# Altium footprint library 6-Connectors-3.PcbLib: 153 footprints (part 4 of 11) (continued)
## PHOENIX_1725711 [mm] "Micro PCB Terminal Block, Pitch 2.54mm, 8 Positions, Screw Connection" (continued)
3D body "PHOENIX_1725711.stp": height 8.5, standoff -3.5, extent -10.39,-3.1 10.39,3.1

## PHOENIX_1725724 [mm] "Micro PCB Terminal Block, Pitch 2.54mm, 9 Positions, Screw Connection"
height 8.5
pads (9):
  round 1.8 hole 1.1: 1(-10.16,0) 2(-7.62,0) 3(-5.08,0) 4(-2.54,0) 5(0,0) 6(2.54,0) 7(5.08,0) 8(7.62,0) 9(10.16,0)
Top Overlay:
  circle w0.2: c10.16,0.05 r1.18
  circle w0.2: c7.62,0.05 r1.18
  circle w0.2: c5.08,0.05 r1.18
  circle w0.2: c2.54,0.05 r1.18
  circle w0.2: c0,0.05 r1.18
  circle w0.2: c-2.54,0.05 r1.18
  circle w0.2: c-5.08,0.05 r1.18
  circle w0.2: c-7.62,0.05 r1.18
  circle w0.2: c-10.16,0.05 r1.18
  lines w0.2: -11.66,-1.417 11.66,-1.417 ; -11.66,-1.132 11.66,-1.132 ; -11.66,1.22 11.66,1.22 ; -11.66,1.51 11.66,1.51 ; -11.66,2.361 11.66,2.361 ; -11.66,2.8 11.66,2.8 ; -10.16,3.429 -10.16,3.81 ; -7.62,3.429 -7.62,3.81 ; -5.08,3.429 -5.08,3.81 ; -2.54,3.429 -2.54,3.81 ; 0,3.429 0,3.81 ; 2.54,3.429 2.54,3.81 ; 5.08,3.429 5.08,3.81 ; 7.62,3.429 7.62,3.81 ; 10.16,3.429 10.16,3.81 ; -11.66,-3.1 11.66,-3.1 11.66,3.1 -11.66,3.1 -11.66,-3.1
  text "9" at 9.779,-1.778 h1
  text "8" at 7.239,-1.778 h1
  text "6" at 2.159,-1.778 h1
  text "4" at -2.921,-1.778 h1
  text "1" at -10.287,-1.778 h1
  text "2" at -8.001,-1.778 h1
  text "3" at -5.461,-1.778 h1
  text "5" at -0.381,-1.778 h1
  text "7" at 4.699,-1.778 h1
Mechanical 8:
  lines w0.1: -10.71,0 -10.16,0 ; -10.71,0 -10.16,0 ; -10.71,0 -10.16,0 ; -10.71,0 -10.16,0 ; -10.16,0 -10.16,0.55 ; -10.16,0 -10.16,0.55 ; -10.16,0 -10.16,0.55 ; -10.16,0 -10.16,0.55 ; -8.17,0 -7.62,0 ; -8.17,0 -7.62,0 ; -8.17,0 -7.62,0 ; -8.17,0 -7.62,0 ; -7.62,0 -7.62,0.55 ; -7.62,0 -7.62,0.55 ; -7.62,0 -7.62,0.55 ; -7.62,0 -7.62,0.55 ; -5.63,0 -5.08,0 ; -5.63,0 -5.08,0 ; -5.63,0 -5.08,0 ; -5.63,0 -5.08,0 ; -5.08,0 -5.08,0.55 ; -5.08,0 -5.08,0.55 ; -5.08,0 -5.08,0.55 ; -5.08,0 -5.08,0.55 ; -3.09,0 -2.54,0 ; -3.09,0 -2.54,0 ; -3.09,0 -2.54,0 ; -3.09,0 -2.54,0 ; -2.54,0 -2.54,0.55 ; -2.54,0 -2.54,0.55 ; -2.54,0 -2.54,0.55 ; -2.54,0 -2.54,0.55 ; -0.55,0 0,0 ; -0.55,0 0,0 ; -0.55,0 0,0 ; -0.55,0 0,0 ; 0,0 0,0.55 ; 0,0 0,0.55 ; 0,0 0,0.55 ; 0,0 0,0.55 ; 1.99,0 2.54,0 ; 1.99,0 2.54,0 ; 1.99,0 2.54,0 ; 1.99,0 2.54,0 ; 2.54,0 2.54,0.55 ; 2.54,0 2.54,0.55 ; 2.54,0 2.54,0.55 ; 2.54,0 2.54,0.55 ; 4.53,0 5.08,0 ; 4.53,0 5.08,0 ; 4.53,0 5.08,0 ; 4.53,0 5.08,0 ; 5.08,0 5.08,0.55 ; 5.08,0 5.08,0.55 ; 5.08,0 5.08,0.55 ; 5.08,0 5.08,0.55 ; 7.07,0 7.62,0 ; 7.07,0 7.62,0 ; 7.07,0 7.62,0 ; 7.07,0 7.62,0 ; 7.62,0 7.62,0.55 ; 7.62,0 7.62,0.55 ; 7.62,0 7.62,0.55 ; 7.62,0 7.62,0.55 ; 9.61,0 10.16,0 ; 9.61,0 10.16,0 ; 9.61,0 10.16,0 ; 9.61,0 10.16,0 ; 10.16,0 10.16,0.55 ; 10.16,0 10.16,0.55 ; 10.16,0 10.16,0.55 ; 10.16,0 10.16,0.55
Mechanical 14:
  circle w0.1: c7.62,0.05 r1.1
  circle w0.1: c5.08,0.05 r1.1
  circle w0.1: c0,0.05 r1.1
  circle w0.1: c-10.16,0.05 r1.1
  circle w0.1: c-7.62,0.05 r1.1
  circle w0.1: c-5.08,0.05 r1.1
  circle w0.1: c-2.54,0.05 r1.1
  circle w0.1: c2.54,0.05 r1.1
  circle w0.1: c10.16,0.05 r1.1
  lines w0.1: -11.66,-1.417 11.66,-1.417 ; -11.66,-1.132 11.66,-1.132 ; -11.66,1.22 11.66,1.22 ; -11.66,1.51 11.66,1.51 ; -11.66,2.361 11.66,2.361 ; -11.66,2.8 11.66,2.8 ; -11.094,0.631 -9.579,-0.884 ; -10.741,0.984 -9.226,-0.531 ; -8.554,0.631 -7.039,-0.884 ; -8.201,0.984 -6.686,-0.531 ; -6.014,0.631 -4.499,-0.884 ; -5.661,0.984 -4.146,-0.531 ; -3.474,0.631 -1.959,-0.884 ; -3.121,0.984 -1.606,-0.531 ; -0.934,0.631 0.581,-0.884 ; -0.581,0.984 0.934,-0.531 ; 1.606,0.631 3.121,-0.884 ; 1.959,0.984 3.474,-0.531 ; 4.146,0.631 5.661,-0.884 ; 4.499,0.984 6.014,-0.531 ; 6.686,0.631 8.201,-0.884 ; 7.039,0.984 8.554,-0.531 ; 9.226,0.631 10.741,-0.884 ; 9.579,0.984 11.094,-0.531 ; -11.66,-3.1 11.66,-3.1 11.66,3.1 -11.66,3.1 -11.66,-3.1 ; -10.635,-1.757 cw(c-10.587,-1.741) -10.608,-1.696 cw(c-10.16,-2.696) -9.712,-1.696 cw(c-9.733,-1.741) -9.685,-1.757 cw(c-10.16,-1.6) -10.635,-1.757 ; -8.095,-1.757 cw(c-8.047,-1.741) -8.068,-1.696 cw(c-7.62,-2.696) -7.172,-1.696 cw(c-7.193,-1.741) -7.145,-1.757 cw(c-7.62,-1.6) -8.095,-1.757 ; -5.555,-1.757 cw(c-5.507,-1.741) -5.528,-1.696 cw(c-5.08,-2.696) -4.632,-1.696 cw(c-4.653,-1.741) -4.605,-1.757 cw(c-5.08,-1.6) -5.555,-1.757 ; -3.015,-1.757 cw(c-2.967,-1.741) -2.988,-1.696 cw(c-2.54,-2.696) -2.092,-1.696 cw(c-2.113,-1.741) -2.065,-1.757 cw(c-2.54,-1.6) -3.015,-1.757 ; -0.475,-1.757 cw(c-0.427,-1.741) -0.448,-1.696 cw(c0,-2.696) 0.448,-1.696 cw(c0.427,-1.741) 0.475,-1.757 cw(c0,-1.6) -0.475,-1.757 ; 2.065,-1.757 cw(c2.113,-1.741) 2.092,-1.696 cw(c2.54,-2.696) 2.988,-1.696 cw(c2.967,-1.741) 3.015,-1.757 cw(c2.54,-1.6) 2.065,-1.757 ; 4.605,-1.757 cw(c4.653,-1.741) 4.632,-1.696 cw(c5.08,-2.696) 5.528,-1.696 cw(c5.507,-1.741) 5.555,-1.757 cw(c5.08,-1.6) 4.605,-1.757 ; 7.145,-1.757 cw(c7.193,-1.741) 7.172,-1.696 cw(c7.62,-2.696) 8.068,-1.696 cw(c8.047,-1.741) 8.095,-1.757 cw(c7.62,-1.6) 7.145,-1.757 ; 9.685,-1.757 cw(c9.733,-1.741) 9.712,-1.696 cw(c10.16,-2.696) 10.608,-1.696 cw(c10.587,-1.741) 10.635,-1.757 cw(c10.16,-1.6) 9.685,-1.757
3D body "PHOENIX_1725724.stp": height 8.5, standoff -3.5, extent -11.66,-3.1 11.66,3.1

## PHOENIX_1725737 [mm] "Micro PCB Terminal Block, Pitch 2.54mm, 10 Positions, Screw Connection"
height 8.5
pads (10):
  round 1.8 hole 1.1: 1(-11.43,0) 2(-8.89,0) 3(-6.35,0) 4(-3.81,0) 5(-1.27,0) 6(1.27,0) 7(3.81,0) 8(6.35,0) 9(8.89,0) 10(11.43,0)
Top Overlay:
  circle w0.2: c11.43,-0.05 r1.18
  circle w0.2: c8.89,-0.05 r1.18
  circle w0.2: c6.35,-0.05 r1.18
  circle w0.2: c3.81,-0.05 r1.18
  circle w0.2: c1.27,-0.05 r1.18
  circle w0.2: c-1.27,-0.05 r1.18
  circle w0.2: c-3.81,-0.05 r1.18
  circle w0.2: c-6.35,-0.05 r1.18
  circle w0.2: c-8.89,-0.05 r1.18
  circle w0.2: c-11.43,-0.05 r1.18
  lines w0.2: -12.93,-2.8 12.93,-2.8 ; -12.93,-2.361 12.93,-2.361 ; -12.93,-1.51 12.93,-1.51 ; -12.93,-1.22 12.93,-1.22 ; -12.93,1.132 12.93,1.132 ; -12.93,1.417 12.93,1.417 ; -11.43,-3.81 -11.43,-3.429 ; -8.89,-3.81 -8.89,-3.429 ; -6.35,-3.81 -6.35,-3.429 ; -3.81,-3.81 -3.81,-3.429 ; -1.27,-3.81 -1.27,-3.429 ; 1.27,-3.81 1.27,-3.429 ; 3.81,-3.81 3.81,-3.429 ; 6.35,-3.81 6.35,-3.429 ; 8.89,-3.81 8.89,-3.429 ; 11.43,-3.81 11.43,-3.429 ; -12.93,-3.1 -12.93,3.1 12.93,3.1 12.93,-3.1 -12.93,-3.1
  text "9" at 8.509,1.778 h1
  text "8" at 5.969,1.778 h1
  text "6" at 0.889,1.778 h1
  text "4" at -4.191,1.778 h1
  text "1" at -11.557,1.778 h1
  text "2" at -9.271,1.778 h1
  text "3" at -6.731,1.778 h1
  text "5" at -1.651,1.778 h1
  text "7" at 3.429,1.778 h1
  text "10" at 11.049,1.778 h1
Mechanical 8:
  lines w0.1: -0.55,0 0,0 0,-0.55 ; -11.98,0 -11.43,0 ; -11.98,0 -11.43,0 ; -11.98,0 -11.43,0 ; -11.98,0 -11.43,0 ; -11.43,-0.55 -11.43,0 ; -11.43,-0.55 -11.43,0 ; -11.43,-0.55 -11.43,0 ; -11.43,-0.55 -11.43,0 ; -9.44,0 -8.89,0 ; -9.44,0 -8.89,0 ; -9.44,0 -8.89,0 ; -9.44,0 -8.89,0 ; -8.89,-0.55 -8.89,0 ; -8.89,-0.55 -8.89,0 ; -8.89,-0.55 -8.89,0 ; -8.89,-0.55 -8.89,0 ; -6.9,0 -6.35,0 ; -6.9,0 -6.35,0 ; -6.9,0 -6.35,0 ; -6.9,0 -6.35,0 ; -6.35,-0.55 -6.35,0 ; -6.35,-0.55 -6.35,0 ; -6.35,-0.55 -6.35,0 ; -6.35,-0.55 -6.35,0 ; -4.36,0 -3.81,0 ; -4.36,0 -3.81,0 ; -4.36,0 -3.81,0 ; -4.36,0 -3.81,0 ; -3.81,-0.55 -3.81,0 ; -3.81,-0.55 -3.81,0 ; -3.81,-0.55 -3.81,0 ; -3.81,-0.55 -3.81,0 ; -1.82,0 -1.27,0 ; -1.82,0 -1.27,0 ; -1.82,0 -1.27,0 ; -1.82,0 -1.27,0 ; -1.27,-0.55 -1.27,0 ; -1.27,-0.55 -1.27,0 ; -1.27,-0.55 -1.27,0 ; -1.27,-0.55 -1.27,0 ; 0.72,0 1.27,0 ; 0.72,0 1.27,0 ; 0.72,0 1.27,0 ; 0.72,0 1.27,0 ; 1.27,-0.55 1.27,0 ; 1.27,-0.55 1.27,0 ; 1.27,-0.55 1.27,0 ; 1.27,-0.55 1.27,0 ; 3.26,0 3.81,0 ; 3.26,0 3.81,0 ; 3.26,0 3.81,0 ; 3.26,0 3.81,0 ; 3.81,-0.55 3.81,0 ; 3.81,-0.55 3.81,0 ; 3.81,-0.55 3.81,0 ; 3.81,-0.55 3.81,0 ; 5.8,0 6.35,0 ; 5.8,0 6.35,0 ; 5.8,0 6.35,0 ; 5.8,0 6.35,0 ; 6.35,-0.55 6.35,0 ; 6.35,-0.55 6.35,0 ; 6.35,-0.55 6.35,0 ; 6.35,-0.55 6.35,0 ; 8.34,0 8.89,0 ; 8.34,0 8.89,0 ; 8.34,0 8.89,0 ; 8.34,0 8.89,0 ; 8.89,-0.55 8.89,0 ; 8.89,-0.55 8.89,0 ; 8.89,-0.55 8.89,0 ; 8.89,-0.55 8.89,0 ; 10.88,0 11.43,0 ; 10.88,0 11.43,0 ; 10.88,0 11.43,0 ; 10.88,0 11.43,0 ; 11.43,-0.55 11.43,0 ; 11.43,-0.55 11.43,0 ; 11.43,-0.55 11.43,0 ; 11.43,-0.55 11.43,0
Mechanical 14:
  circle w0.1: c11.43,-0.05 r1.1
  circle w0.1: c6.35,-0.05 r1.1
  circle w0.1: c3.81,-0.05 r1.1
  circle w0.1: c-1.27,-0.05 r1.1
  circle w0.1: c-11.43,-0.05 r1.1
  circle w0.1: c-8.89,-0.05 r1.1
  circle w0.1: c-6.35,-0.05 r1.1
  circle w0.1: c-3.81,-0.05 r1.1
  circle w0.1: c1.27,-0.05 r1.1
  circle w0.1: c8.89,-0.05 r1.1
  lines w0.1: -12.93,-2.8 12.93,-2.8 ; -12.93,-2.361 12.93,-2.361 ; -12.93,-1.51 12.93,-1.51 ; -12.93,-1.22 12.93,-1.22 ; -12.93,1.132 12.93,1.132 ; -12.93,1.417 12.93,1.417 ; -12.364,-0.631 -10.849,0.884 ; -12.011,-0.984 -10.496,0.531 ; -9.824,-0.631 -8.309,0.884 ; -9.471,-0.984 -7.956,0.531 ; -7.284,-0.631 -5.769,0.884 ; -6.931,-0.984 -5.416,0.531 ; -4.744,-0.631 -3.229,0.884 ; -4.391,-0.984 -2.876,0.531 ; -2.204,-0.631 -0.689,0.884 ; -1.851,-0.984 -0.336,0.531 ; 0.336,-0.631 1.851,0.884 ; 0.689,-0.984 2.204,0.531 ; 2.876,-0.631 4.391,0.884 ; 3.229,-0.984 4.744,0.531 ; 5.416,-0.631 6.931,0.884 ; 5.769,-0.984 7.284,0.531 ; 7.956,-0.631 9.471,0.884 ; 8.309,-0.984 9.824,0.531 ; 10.496,-0.631 12.011,0.884 ; 10.849,-0.984 12.364,0.531 ; -12.93,-3.1 -12.93,3.1 12.93,3.1 12.93,-3.1 -12.93,-3.1 ; -11.905,1.757 ccw(c-11.857,1.741) -11.878,1.696 ccw(c-11.43,2.696) -10.982,1.696 ccw(c-11.003,1.741) -10.955,1.757 ccw(c-11.43,1.6) -11.905,1.757 ; -9.365,1.757 ccw(c-9.317,1.741) -9.338,1.696 ccw(c-8.89,2.696) -8.442,1.696 ccw(c-8.463,1.741) -8.415,1.757 ccw(c-8.89,1.6) -9.365,1.757 ; -6.825,1.757 ccw(c-6.777,1.741) -6.798,1.696 ccw(c-6.35,2.696) -5.902,1.696 ccw(c-5.923,1.741) -5.875,1.757 ccw(c-6.35,1.6) -6.825,1.757 ; -4.285,1.757 ccw(c-4.237,1.741) -4.258,1.696 ccw(c-3.81,2.696) -3.362,1.696 ccw(c-3.383,1.741) -3.335,1.757 ccw(c-3.81,1.6) -4.285,1.757 ; -1.745,1.757 ccw(c-1.697,1.741) -1.718,1.696 ccw(c-1.27,2.696) -0.822,1.696 ccw(c-0.843,1.741) -0.795,1.757 ccw(c-1.27,1.6) -1.745,1.757 ; 0.795,1.757 ccw(c0.843,1.741) 0.822,1.696 ccw(c1.27,2.696) 1.718,1.696 ccw(c1.697,1.741) 1.745,1.757 ccw(c1.27,1.6) 0.795,1.757 ; 3.335,1.757 ccw(c3.383,1.741) 3.362,1.696 ccw(c3.81,2.696) 4.258,1.696 ccw(c4.237,1.741) 4.285,1.757 ccw(c3.81,1.6) 3.335,1.757 ; 5.875,1.757 ccw(c5.923,1.741) 5.902,1.696 ccw(c6.35,2.696) 6.798,1.696 ccw(c6.777,1.741) 6.825,1.757 ccw(c6.35,1.6) 5.875,1.757 ; 8.415,1.757 ccw(c8.463,1.741) 8.442,1.696 ccw(c8.89,2.696) 9.338,1.696 ccw(c9.317,1.741) 9.365,1.757 ccw(c8.89,1.6) 8.415,1.757 ; 10.955,1.757 cw(c11.43,1.6) 11.905,1.757 cw(c11.857,1.741) 11.878,1.696 cw(c11.43,2.696) 10.982,1.696 cw(c11.003,1.741) 10.955,1.757
3D body "PHOENIX_1725737.stp": height 8.5, standoff -3.5, extent -12.93,-3.1 12.93,3.1

## PHOENIX_1727036 [mm] "PCB Terminal Block, Pitch 3.81mm, 4 Positions, Screw Connection"
height 8.5
pads (4):
  round 1.8 hole 1.1: 1(-5.715,-0.05) 2(-1.905,-0.05) 3(1.905,-0.05) 4(5.715,-0.05)
Top Overlay:
  circle w0.2: c1.905,-0.05 r1.45
  circle w0.2: c5.715,-0.05 r1.45
  circle w0.2: c-1.905,-0.05 r1.45
  circle w0.2: c-5.715,-0.05 r1.45
  circle w0.2: c5.715,-0.05 r1.4
  circle w0.2: c1.905,-0.05 r1.4
  circle w0.2: c-1.905,-0.05 r1.4
  circle w0.2: c-5.715,-0.05 r1.4
  lines w0.2: -7.62,-3.3 7.62,-3.3 ; -7.62,-2.861 7.62,-2.861 ; -7.62,-2.049 7.62,-2.049 ; -7.62,-1.566 7.62,-1.566 ; -7.62,1.487 7.62,1.487 ; -7.62,1.962 -6.017,1.962 ; -6.921,-0.761 -6.848,-0.688 ; -6.426,-1.256 -6.353,-1.183 ; -5.715,-3.981 -5.715,-3.6 ; -5.413,1.962 -2.207,1.962 ; -5.077,1.083 -5.004,1.156 ; -4.582,0.588 -4.509,0.661 ; -3.111,-0.761 -3.038,-0.688 ; -2.616,-1.256 -2.543,-1.183 ; -1.905,-3.981 -1.905,-3.6 ; -1.603,1.962 1.603,1.962 ; -1.267,1.083 -1.194,1.156 ; -0.772,0.588 -0.699,0.661 ; 0.699,-0.761 0.772,-0.688 ; 1.194,-1.256 1.267,-1.183 ; 1.905,-3.981 1.905,-3.6 ; 2.207,1.962 5.413,1.962 ; 2.543,1.083 2.616,1.156 ; 3.038,0.588 3.111,0.661 ; 4.509,-0.761 4.582,-0.688 ; 5.004,-1.256 5.077,-1.183 ; 5.715,-3.981 5.715,-3.6 ; 6.017,1.962 7.62,1.962 ; 6.353,1.083 6.426,1.156 ; 6.848,0.588 6.921,0.661 ; -7.62,-3.6 7.62,-3.6 7.62,3.7 -7.62,3.7 -7.62,-3.6 ; -6.016,1.923 cw(c-5.715,1.948) -5.414,1.923 cw(c-5.715,2.098) -6.016,1.923 ; -2.206,1.923 cw(c-1.905,1.948) -1.604,1.923 cw(c-1.905,2.098) -2.206,1.923 ; 1.604,1.923 cw(c1.905,1.948) 2.206,1.923 cw(c1.905,2.098) 1.604,1.923 ; 5.414,1.923 cw(c5.715,1.948) 6.016,1.923 cw(c5.715,2.098) 5.414,1.923
  text "1" at -5.925,2.525 h1
  text "2" at -2.115,2.525 h1
  text "3" at 1.695,2.525 h1
  text "4" at 5.505,2.525 h1
Mechanical 8:
  lines w0.1: -6.215,-0.05 -5.715,-0.05 ; -5.715,-0.55 -5.715,-0.05 ; -5.715,0.45 -5.715,-0.05 ; -5.215,-0.05 -5.715,-0.05 ; -2.405,-0.05 -1.905,-0.05 ; -1.905,-0.55 -1.905,-0.05 ; -1.905,0.45 -1.905,-0.05 ; -1.405,-0.05 -1.905,-0.05 ; -0.5,0 0,0 ; 0,-0.5 0,0 ; 0,0.5 0,0 ; 0.5,0 0,0 ; 1.405,-0.05 1.905,-0.05 ; 1.905,-0.55 1.905,-0.05 ; 1.905,0.45 1.905,-0.05 ; 2.405,-0.05 1.905,-0.05 ; 5.215,-0.05 5.715,-0.05 ; 5.715,-0.55 5.715,-0.05 ; 5.715,0.45 5.715,-0.05 ; 6.215,-0.05 5.715,-0.05
Mechanical 14:
  circle w0.1: c1.905,-0.05 r1.45
  circle w0.1: c5.715,-0.05 r1.45
  circle w0.1: c-1.905,-0.05 r1.45
  circle w0.1: c-5.715,-0.05 r1.45
  circle w0.1: c5.715,-0.05 r1.4
  circle w0.1: c1.905,-0.05 r1.4
  circle w0.1: c-1.905,-0.05 r1.4
  circle w0.1: c-5.715,-0.05 r1.4
  lines w0.1: -7.62,-3.3 7.62,-3.3 ; -7.62,-2.861 7.62,-2.861 ; -7.62,-2.049 7.62,-2.049 ; -7.62,-1.566 7.62,-1.566 ; -7.62,1.487 7.62,1.487 ; -7.62,1.962 -6.017,1.962 ; -6.921,-0.761 -5.004,1.156 ; -6.426,-1.256 -4.509,0.661 ; -5.715,-3.981 -5.715,-3.6 ; -5.413,1.962 -2.207,1.962 ; -3.111,-0.761 -1.194,1.156 ; -2.616,-1.256 -0.699,0.661 ; -1.905,-3.981 -1.905,-3.6 ; -1.603,1.962 1.603,1.962 ; 0.699,-0.761 2.616,1.156 ; 1.194,-1.256 3.111,0.661 ; 1.905,-3.981 1.905,-3.6 ; 2.207,1.962 5.413,1.962 ; 4.509,-0.761 6.426,1.156 ; 5.004,-1.256 6.921,0.661 ; 5.715,-3.981 5.715,-3.6 ; 6.017,1.962 7.62,1.962 ; -7.62,-3.6 7.62,-3.6 7.62,3.7 -7.62,3.7 -7.62,-3.6 ; -6.016,1.923 cw(c-5.715,1.948) -5.414,1.923 cw(c-5.715,2.098) -6.016,1.923 ; -2.206,1.923 cw(c-1.905,1.948) -1.604,1.923 cw(c-1.905,2.098) -2.206,1.923 ; 1.604,1.923 cw(c1.905,1.948) 2.206,1.923 cw(c1.905,2.098) 1.604,1.923 ; 5.414,1.923 cw(c5.715,1.948) 6.016,1.923 cw(c5.715,2.098) 5.414,1.923
  text "1" at -5.925,2.525 h1
  text "2" at -2.115,2.525 h1
  text "3" at 1.695,2.525 h1
  text "4" at 5.505,2.525 h1
3D body "PHOENIX_1727036.stp": height 8.5, standoff -3.5, extent -7.62,-3.6 7.62,3.7

## PHOENIX_1727065 [mm] "PCB Terminal Block, Pitch 3.81mm, 7 Positions, Screw Connection"
height 8.5
pads (7):
  round 1.8 hole 1.1: 1(-11.43,0) 2(-7.62,0) 3(-3.81,0) 4(0,0) 5(3.81,0) 6(7.62,0) 7(11.43,0)
Top Overlay:
  circle w0.2: c11.43,0 r1.4
  circle w0.2: c11.43,0 r1.45
  circle w0.2: c7.62,0 r1.4
  circle w0.2: c7.62,0 r1.45
  circle w0.2: c3.81,0 r1.4
  circle w0.2: c3.81,0 r1.45
  circle w0.2: c0,0 r1.4
  circle w0.2: c0,0 r1.45
  circle w0.2: c-3.81,0 r1.4
  circle w0.2: c-3.81,0 r1.45
  circle w0.2: c-7.62,0 r1.4
  circle w0.2: c-7.62,0 r1.45
  circle w0.2: c-11.43,0 r1.4
  circle w0.2: c-11.43,0 r1.45
  lines w0.2: -13.335,-3.25 13.335,-3.25 ; -13.335,-2.811 13.335,-2.811 ; -13.335,-1.999 13.335,-1.999 ; -13.335,-1.516 13.335,-1.516 ; -13.335,1.537 13.335,1.537 ; -13.335,2.012 -11.732,2.012 ; -12.636,-0.711 -12.563,-0.638 ; -12.141,-1.206 -12.068,-1.133 ; -11.43,-3.931 -11.43,-3.55 ; -11.128,2.012 -7.922,2.012 ; -10.792,1.133 -10.719,1.206 ; -10.297,0.638 -10.224,0.711 ; -8.826,-0.711 -8.753,-0.638 ; -8.331,-1.206 -8.258,-1.133 ; -7.62,-3.931 -7.62,-3.55 ; -7.318,2.012 -4.112,2.012 ; -6.982,1.133 -6.909,1.206 ; -6.487,0.638 -6.414,0.711 ; -5.016,-0.711 -4.943,-0.638 ; -4.521,-1.206 -4.448,-1.133 ; -3.81,-3.931 -3.81,-3.55 ; -3.508,2.012 -0.302,2.012 ; -3.172,1.133 -3.099,1.206 ; -2.677,0.638 -2.604,0.711 ; -1.206,-0.711 -1.133,-0.638 ; -0.711,-1.206 -0.638,-1.133 ; 0,-3.931 0,-3.55 ; 0.302,2.012 3.508,2.012 ; 0.638,1.133 0.711,1.206 ; 1.133,0.638 1.206,0.711 ; 2.604,-0.711 2.677,-0.638 ; 3.099,-1.206 3.172,-1.133 ; 3.81,-3.931 3.81,-3.55 ; 4.112,2.012 7.318,2.012 ; 4.448,1.133 4.521,1.206 ; 4.943,0.638 5.016,0.711 ; 6.414,-0.711 6.487,-0.638 ; 6.909,-1.206 6.982,-1.133 ; 7.62,-3.931 7.62,-3.55 ; 7.922,2.012 11.128,2.012 ; 8.258,1.133 8.331,1.206 ; 8.753,0.638 8.826,0.711 ; 10.224,-0.711 10.297,-0.638 ; 10.719,-1.206 10.792,-1.133 ; 11.43,-3.931 11.43,-3.55 ; 11.732,2.012 13.335,2.012 ; 12.068,1.133 12.141,1.206 ; 12.563,0.638 12.636,0.711 ; -13.335,-3.55 -13.335,3.75 13.335,3.75 13.335,-3.55 -13.335,-3.55 ; -11.731,1.973 ccw(c-11.43,2.148) -11.129,1.973 ccw(c-11.43,1.998) -11.731,1.973 ; -7.921,1.973 ccw(c-7.62,2.148) -7.319,1.973 ccw(c-7.62,1.998) -7.921,1.973 ; -4.111,1.973 ccw(c-3.81,2.148) -3.509,1.973 ccw(c-3.81,1.998) -4.111,1.973 ; -0.301,1.973 ccw(c0,2.148) 0.301,1.973 ccw(c0,1.998) -0.301,1.973 ; 3.509,1.973 ccw(c3.81,2.148) 4.111,1.973 ccw(c3.81,1.998) 3.509,1.973 ; 7.319,1.973 ccw(c7.62,2.148) 7.921,1.973 ccw(c7.62,1.998) 7.319,1.973 ; 11.129,1.973 ccw(c11.43,2.148) 11.731,1.973 ccw(c11.43,1.998) 11.129,1.973
  text "7" at 11.22,2.575 h1
  text "6" at 7.41,2.575 h1
  text "5" at 3.6,2.575 h1
  text "4" at -0.21,2.575 h1
  text "3" at -4.02,2.575 h1
  text "2" at -7.83,2.575 h1
  text "1" at -11.64,2.575 h1
Mechanical 8:
  lines w0.1: -11.93,0 -11.43,0 ; -11.43,-0.5 -11.43,0 ; -11.43,0.5 -11.43,0 ; -10.93,0 -11.43,0 ; -8.12,0 -7.62,0 ; -7.62,-0.5 -7.62,0 ; -7.62,0.5 -7.62,0 ; -7.12,0 -7.62,0 ; -4.31,0 -3.81,0 ; -3.81,-0.5 -3.81,0 ; -3.81,0.5 -3.81,0 ; -3.31,0 -3.81,0 ; 3.31,0 3.81,0 ; 3.81,-0.5 3.81,0 ; 3.81,0.5 3.81,0 ; 4.31,0 3.81,0 ; 7.12,0 7.62,0 ; 7.62,-0.5 7.62,0 ; 7.62,0.5 7.62,0 ; 8.12,0 7.62,0 ; 10.93,0 11.43,0 ; 11.43,-0.5 11.43,0 ; 11.43,0.5 11.43,0 ; 11.93,0 11.43,0 ; 0,0 -0.5,0 0,0 ; 0,0 0,-0.5 0,0 ; 0,0 0.5,0 0,0 ; 0,0 0,0.5 0,0
Mechanical 14:
  circle w0.1: c11.43,0 r1.4
  circle w0.1: c11.43,0 r1.45
  circle w0.1: c7.62,0 r1.4
  circle w0.1: c7.62,0 r1.45
  circle w0.1: c3.81,0 r1.4
  circle w0.1: c3.81,0 r1.45
  circle w0.1: c0,0 r1.4
  circle w0.1: c0,0 r1.45
  circle w0.1: c-3.81,0 r1.4
  circle w0.1: c-3.81,0 r1.45
  circle w0.1: c-7.62,0 r1.4
  circle w0.1: c-7.62,0 r1.45
  circle w0.1: c-11.43,0 r1.4
  circle w0.1: c-11.43,0 r1.45
  lines w0.1: -13.335,-3.25 13.335,-3.25 ; -13.335,-2.811 13.335,-2.811 ; -13.335,-1.999 13.335,-1.999 ; -13.335,-1.516 13.335,-1.516 ; -13.335,1.537 13.335,1.537 ; -13.335,2.012 -11.732,2.012 ; -12.636,-0.711 -10.719,1.206 ; -12.141,-1.206 -10.224,0.711 ; -11.43,-3.931 -11.43,-3.55 ; -11.128,2.012 -7.922,2.012 ; -8.826,-0.711 -6.909,1.206 ; -8.331,-1.206 -6.414,0.711 ; -7.62,-3.931 -7.62,-3.55 ; -7.318,2.012 -4.112,2.012 ; -5.016,-0.711 -3.099,1.206 ; -4.521,-1.206 -2.604,0.711 ; -3.81,-3.931 -3.81,-3.55 ; -3.508,2.012 -0.302,2.012 ; -1.206,-0.711 0.711,1.206 ; -0.711,-1.206 1.206,0.711 ; 0,-3.931 0,-3.55 ; 0.302,2.012 3.508,2.012 ; 2.604,-0.711 4.521,1.206 ; 3.099,-1.206 5.016,0.711 ; 3.81,-3.931 3.81,-3.55 ; 4.112,2.012 7.318,2.012 ; 6.414,-0.711 8.331,1.206 ; 6.909,-1.206 8.826,0.711 ; 7.62,-3.931 7.62,-3.55 ; 7.922,2.012 11.128,2.012 ; 10.224,-0.711 12.141,1.206 ; 10.719,-1.206 12.636,0.711 ; 11.43,-3.931 11.43,-3.55 ; 11.732,2.012 13.335,2.012 ; -13.335,-3.55 -13.335,3.75 13.335,3.75 13.335,-3.55 -13.335,-3.55 ; -11.731,1.973 ccw(c-11.43,2.148) -11.129,1.973 ccw(c-11.43,1.998) -11.731,1.973 ; -7.921,1.973 ccw(c-7.62,2.148) -7.319,1.973 ccw(c-7.62,1.998) -7.921,1.973 ; -4.111,1.973 ccw(c-3.81,2.148) -3.509,1.973 ccw(c-3.81,1.998) -4.111,1.973 ; -0.301,1.973 ccw(c0,2.148) 0.301,1.973 ccw(c0,1.998) -0.301,1.973 ; 3.509,1.973 ccw(c3.81,2.148) 4.111,1.973 ccw(c3.81,1.998) 3.509,1.973 ; 7.319,1.973 ccw(c7.62,2.148) 7.921,1.973 ccw(c7.62,1.998) 7.319,1.973 ; 11.129,1.973 ccw(c11.43,2.148) 11.731,1.973 ccw(c11.43,1.998) 11.129,1.973
  text "7" at 11.22,2.575 h1
  text "6" at 7.41,2.575 h1
  text "5" at 3.6,2.575 h1
  text "4" at -0.21,2.575 h1
  text "3" at -4.02,2.575 h1
  text "2" at -7.83,2.575 h1
  text "1" at -11.64,2.575 h1
3D body "PHOENIX_1727065.stp": height 8.5, standoff -3.5, extent -13.335,-3.6 13.335,3.7

## PHOENIX_1728349 [mm] "PC Terminal Block, Pitch 3.81mm, 8 Positions, Screw Connection"
height 9.5
pads (8):
  round 1.8 hole 1.1: 1(-13.335,0) 2(-9.525,0) 3(-5.715,0) 4(-1.905,0) 5(1.905,0) 6(5.715,0) 7(9.525,0) 8(13.335,0)
Top Overlay:
  drawing of 612 lines, arcs and shapes, not listed
  text "8" at 13.002,4.875 h1.2
  text "7" at 9.192,4.875 h1.2
  text "6" at 5.405,4.875 h1.2
  text "5" at 1.572,4.875 h1.2
  text "4" at -2.262,4.875 h1.2
  text "3" at -6.048,4.875 h1.2
  text "2" at -9.858,4.875 h1.2
  text "1" at -13.454,4.875 h1.2
Mechanical 1:
  text "1" at -13.454,4.875 h1.2
  text "2" at -9.858,4.875 h1.2
  text "3" at -6.048,4.875 h1.2
  text "4" at -2.262,4.875 h1.2
  text "5" at 1.572,4.875 h1.2
  text "6" at 5.406,4.875 h1.2
  text "7" at 9.192,4.875 h1.2
  text "8" at 13.002,4.875 h1.2
Mechanical 8:
  lines w0.1: -14.335,0 -13.335,0 -13.335,-1 ; -10.525,0 -9.525,0 -9.525,-1 ; -6.715,0 -5.715,0 -5.715,-1 ; -2.905,0 -1.905,0 -1.905,-1 ; -1,0 0,0 0,-1 ; 0.905,0 1.905,0 1.905,-1 ; 4.715,0 5.715,0 5.715,-1 ; 8.525,0 9.525,0 9.525,-1 ; 12.335,0 13.335,0 13.335,-1 ; -13.335,-0.55 ccw(c-13.335,0) -13.335,0.55 ccw(c-13.335,0) -13.335,-0.55 ; -9.525,-0.55 ccw(c-9.525,0) -9.525,0.55 ccw(c-9.525,0) -9.525,-0.55 ; -5.715,-0.55 ccw(c-5.715,0) -5.715,0.55 ccw(c-5.715,0) -5.715,-0.55 ; -1.905,-0.55 cw(c-1.905,0) -1.905,0.55 cw(c-1.905,0) -1.905,-0.55 ; 1.905,-0.55 cw(c1.905,0) 1.905,0.55 cw(c1.905,0) 1.905,-0.55 ; 5.715,-0.55 ccw(c5.715,0) 5.715,0.55 ccw(c5.715,0) 5.715,-0.55 ; 9.525,-0.55 cw(c9.525,0) 9.525,0.55 cw(c9.525,0) 9.525,-0.55 ; 13.335,-0.55 ccw(c13.335,0) 13.335,0.55 ccw(c13.335,0) 13.335,-0.55
Mechanical 14:
  drawing of 915 lines, arcs and shapes, not listed
3D body "PHOENIX_1728349.stp": height 9.5, standoff -3.5, extent -15.24,-5.7 15.24,4.3